# Altium footprint library 6-Connectors-4.PcbLib: 166 footprints (part 1 of 12)
Each footprint in its own frame and in the unit in brackets; x right, y up, seen from the top. Pads: shape width x height; smd on the part's side, far side on the other; paste and mask are expansions set on the pad; w line width, h text height; cw(c..) or ccw(c..) is an arc to the next point about the centre after c.
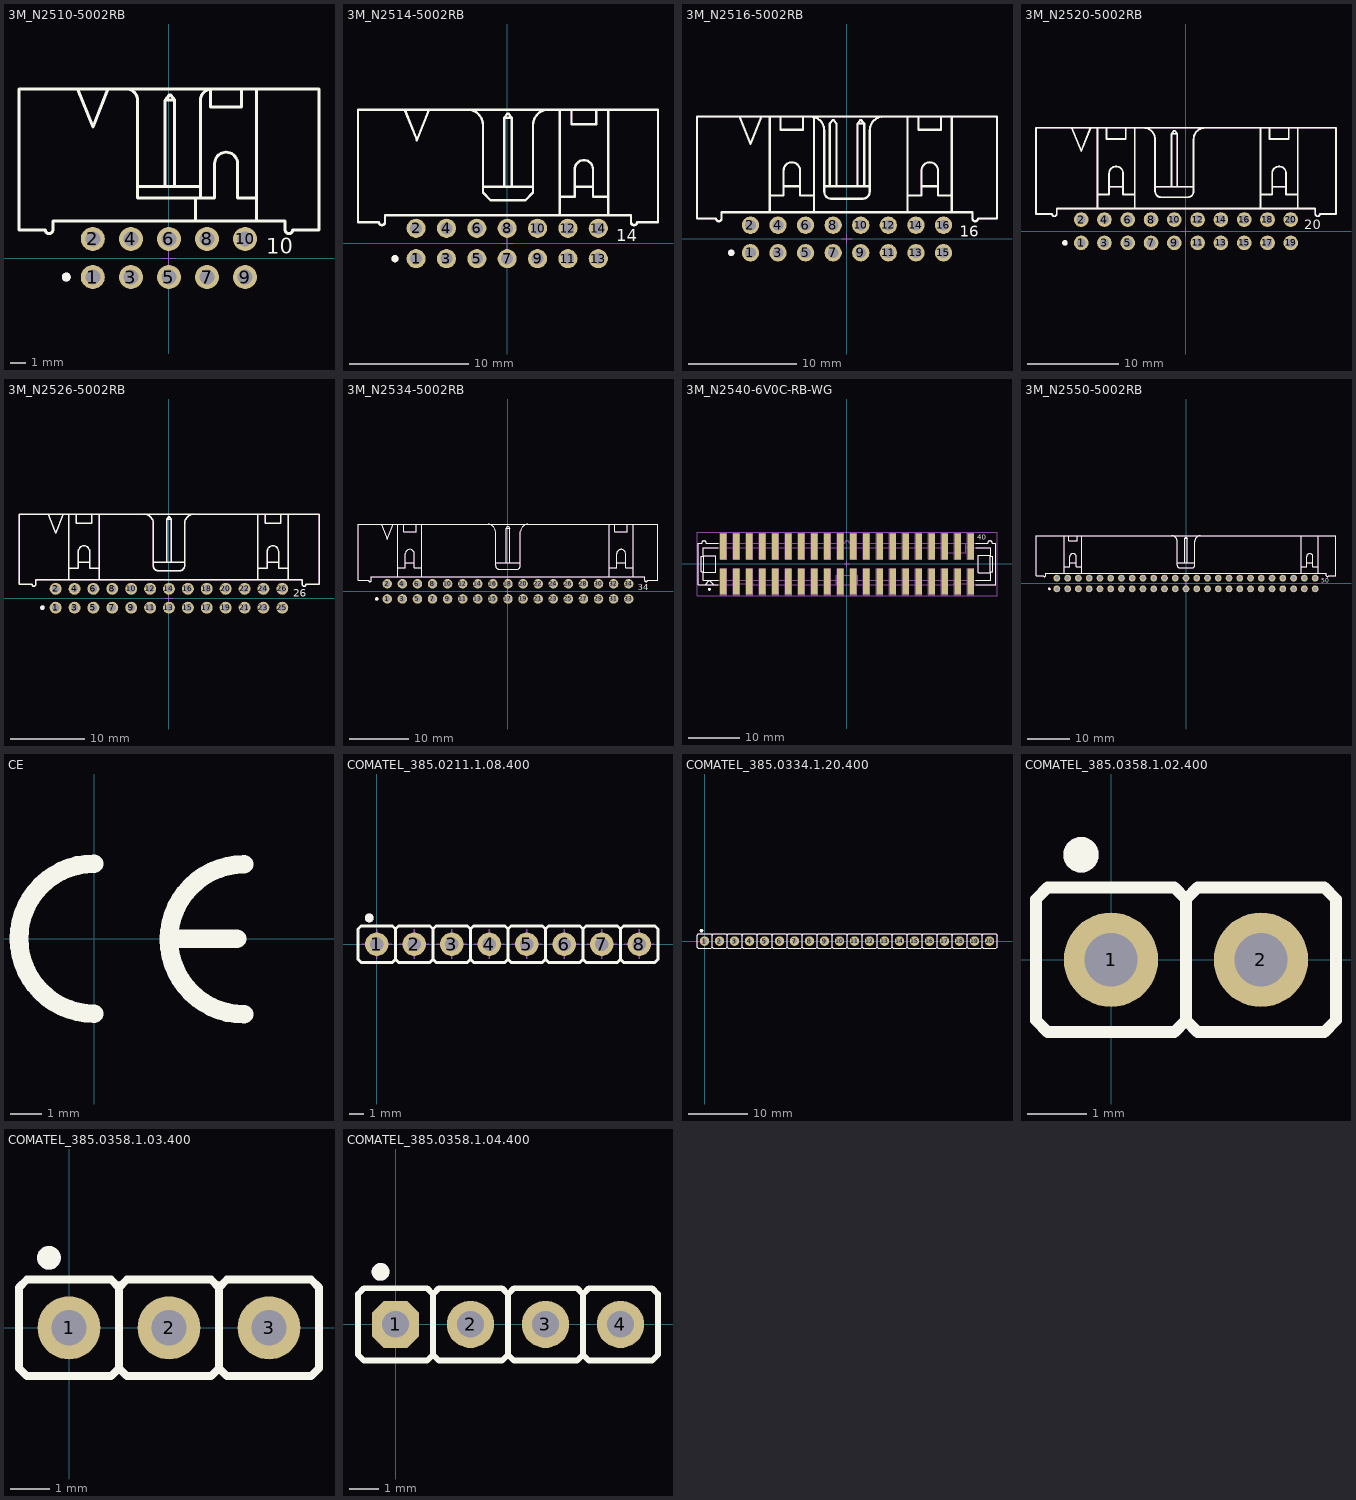
[diagram p0: the footprints below, top view; thin cyan lines are the x and y axes]

## 3M_N2510-5002RB [mm] "10 Contacts - Right Angle .100\" x .100\" Low Profile Four-Wall Header"
height 8.59
pads (10):
  round 1.6 hole 1: 1(-5.08,-1.27) 2(-5.08,1.27) 3(-2.54,-1.27) 4(-2.54,1.27) 5(0,-1.27) 6(0,1.27) 7(2.54,-1.27) 8(2.54,1.27) 9(5.08,-1.27) 10(5.08,1.27)
Top Overlay:
  circle w0.3: c-6.85,-1.27 r0.15
  lines w0.2: -6.093,11.28 -5.077,8.74 -4.061,11.28 ; -2.854,11.28 cw(c-2.854,10.518) -2.092,10.518 -2.092,4.015 2.099,4.015 2.099,10.518 ; -2.092,4.76 2.092,4.76 ; -0.249,4.76 -0.249,10.526 0.012,10.86 0.125,10.86 0.38,10.534 -0.243,10.534 ; 0.38,4.76 0.38,10.526 ; 1.781,2.466 1.781,4.015 3.051,4.015 3.051,6.301 cw(c3.813,6.301) 4.575,6.301 4.575,4.015 5.845,4.015 ; 2.099,10.518 cw(c2.861,10.518) 2.772,11.274 ; 2.772,11.28 2.772,10.06 4.855,10.06 4.855,11.28 ; 5.845,2.466 5.845,11.28 ; -10.004,1.882 -8.252,1.882 ccw(c-7.998,1.882) -7.744,1.882 -7.744,2.466 7.75,2.466 7.75,1.882 ccw(c8.004,1.882) 8.258,1.882 10.011,1.882 10.011,11.28 -10.004,11.28 -10.004,1.882
  text "10" at 6.5,0.3 h1.02
Mechanical 14:
  circle w0.3: c-6.85,-1.27 r0.15
  lines w0.1: -6.093,11.28 -5.077,8.74 -4.061,11.28 ; -2.854,11.28 cw(c-2.854,10.518) -2.092,10.518 -2.092,4.015 2.099,4.015 2.099,10.518 ; -2.092,4.76 2.092,4.76 ; -0.249,4.76 -0.249,10.526 0.012,10.86 0.125,10.86 0.38,10.534 -0.243,10.534 ; 0.38,4.76 0.38,10.526 ; 1.781,2.466 1.781,4.015 3.051,4.015 3.051,6.301 cw(c3.813,6.301) 4.575,6.301 4.575,4.015 5.845,4.015 ; 2.099,10.518 cw(c2.861,10.518) 2.772,11.274 ; 2.772,11.28 2.772,10.06 4.855,10.06 4.855,11.28 ; 5.845,2.466 5.845,11.28 ; -10.004,1.882 -8.252,1.882 ccw(c-7.998,1.882) -7.744,1.882 -7.744,2.466 7.75,2.466 7.75,1.882 ccw(c8.004,1.882) 8.258,1.882 10.011,1.882 10.011,11.28 -10.004,11.28 -10.004,1.882
  text "10" at 6.5,0.3 h1.02
Mechanical 15:
  lines w0.05: -0.5,0 0.5,0 ; 0,-0.5 0,0.5
3D body "3M_N2510-5002RB.stp": height 8.64, standoff -3.98, extent -10.033,-1.778 9.982,11.076
3D body "v160-100.stp": height 0.02, standoff -1.65, extent -5.88,0.47 -4.28,2.07
3D body "v160-100.stp": height 0.02, standoff -1.65, extent -5.88,-2.07 -4.28,-0.47
3D body "v160-100.stp": height 0.02, standoff -1.65, extent -3.34,0.47 -1.74,2.07
3D body "v160-100.stp": height 0.02, standoff -1.65, extent -3.34,-2.07 -1.74,-0.47
3D body "v160-100.stp": height 0.02, standoff -1.65, extent -0.8,-2.07 0.8,-0.47
3D body "v160-100.stp": height 0.02, standoff -1.65, extent -0.8,0.47 0.8,2.07
3D body "v160-100.stp": height 0.02, standoff -1.65, extent 1.74,-2.07 3.34,-0.47
3D body "v160-100.stp": height 0.02, standoff -1.65, extent 1.74,0.47 3.34,2.07
3D body "v160-100.stp": height 0.02, standoff -1.65, extent 4.28,-2.07 5.88,-0.47
3D body "v160-100.stp": height 0.02, standoff -1.65, extent 4.28,0.47 5.88,2.07

## 3M_N2514-5002RB [mm] "14 Contacts - Right Angle .100\" x .100\" Low Profile Four-Wall Header"
height 8.59
pads (14):
  round 1.6 hole 1: 1(-7.62,-1.27) 2(-7.62,1.27) 3(-5.08,-1.27) 4(-5.08,1.27) 5(-2.54,-1.27) 6(-2.54,1.27) 7(0,-1.27) 8(0,1.27) 9(2.54,-1.27) 10(2.54,1.27) 11(5.08,-1.27) 12(5.08,1.27) 13(7.62,-1.27) 14(7.62,1.27)
Top Overlay:
  circle w0.3: c-9.39,-1.27 r0.15
  lines w0.2: -8.568,11.186 -7.552,8.646 -6.536,11.186 ; -3.297,11.186 cw(c-3.297,9.916) -2.027,9.916 -2.027,4.252 -1.392,3.617 1.529,3.617 2.164,4.252 2.164,9.916 cw(c3.434,9.916) 3.434,11.186 ; -2.027,4.76 2.164,4.76 ; -0.249,4.76 -0.249,10.526 0.012,10.86 0.125,10.86 0.38,10.534 -0.243,10.534 ; 0.38,4.76 0.38,10.526 ; 4.399,2.372 4.399,11.186 ; 4.399,3.922 5.656,3.922 5.656,6.208 cw(c6.418,6.208) 7.18,6.208 7.18,3.922 8.45,3.922 ; 5.377,11.186 5.377,9.967 7.46,9.967 7.46,11.186 ; 5.656,4.76 7.18,4.76 ; 8.45,2.372 8.45,11.186 ; -12.479,1.788 -12.479,11.186 12.616,11.186 12.616,1.788 10.863,1.788 cw(c10.609,1.788) 10.355,1.788 10.355,2.372 -10.219,2.372 -10.219,1.788 cw(c-10.473,1.788) -10.727,1.788 -12.479,1.788
  text "14" at 9.105,0.207 h1.02
Mechanical 14:
  circle w0.3: c-9.39,-1.27 r0.15
  lines w0.1: -8.568,11.186 -7.552,8.646 -6.536,11.186 ; -3.297,11.186 cw(c-3.297,9.916) -2.027,9.916 -2.027,4.252 -1.392,3.617 1.529,3.617 2.164,4.252 2.164,9.916 cw(c3.434,9.916) 3.434,11.186 ; -2.027,4.76 2.164,4.76 ; -0.249,4.76 -0.249,10.526 0.012,10.86 0.125,10.86 0.38,10.534 -0.243,10.534 ; 0.38,4.76 0.38,10.526 ; 4.399,2.372 4.399,11.186 ; 4.399,3.922 5.656,3.922 5.656,6.208 cw(c6.418,6.208) 7.18,6.208 7.18,3.922 8.45,3.922 ; 5.377,11.186 5.377,9.967 7.46,9.967 7.46,11.186 ; 5.656,4.76 7.18,4.76 ; 8.45,2.372 8.45,11.186 ; -12.479,1.788 -12.479,11.186 12.616,11.186 12.616,1.788 10.863,1.788 cw(c10.609,1.788) 10.355,1.788 10.355,2.372 -10.219,2.372 -10.219,1.788 cw(c-10.473,1.788) -10.727,1.788 -12.479,1.788
  text "14" at 9.105,0.207 h1.02
Mechanical 15:
  lines w0.05: -0.5,0 0.5,0 ; 0,-0.5 0,0.5
3D body "v160-100.stp": height 0.02, standoff -1.65, extent 6.82,0.47 8.42,2.07
3D body "v160-100.stp": height 0.02, standoff -1.65, extent 6.82,-2.07 8.42,-0.47
3D body "v160-100.stp": height 0.02, standoff -1.65, extent 4.28,0.47 5.88,2.07
3D body "v160-100.stp": height 0.02, standoff -1.65, extent 4.28,-2.07 5.88,-0.47
3D body "v160-100.stp": height 0.02, standoff -1.65, extent 1.74,0.47 3.34,2.07
3D body "v160-100.stp": height 0.02, standoff -1.65, extent 1.74,-2.07 3.34,-0.47
3D body "v160-100.stp": height 0.02, standoff -1.65, extent -0.8,0.47 0.8,2.07
3D body "v160-100.stp": height 0.02, standoff -1.65, extent -0.8,-2.07 0.8,-0.47
3D body "v160-100.stp": height 0.02, standoff -1.65, extent -3.34,0.47 -1.74,2.07
3D body "v160-100.stp": height 0.02, standoff -1.65, extent -3.34,-2.07 -1.74,-0.47
3D body "v160-100.stp": height 0.02, standoff -1.65, extent -5.88,0.47 -4.28,2.07
3D body "v160-100.stp": height 0.02, standoff -1.65, extent -5.88,-2.07 -4.28,-0.47
3D body "v160-100.stp": height 0.02, standoff -1.65, extent -8.42,0.47 -6.82,2.07
3D body "v160-100.stp": height 0.02, standoff -1.65, extent -8.42,-2.07 -6.82,-0.47
3D body "3M_N2514-5002RB.stp": height 8.64, standoff -3.98, extent -12.479,-1.681 12.616,11.174

## 3M_N2516-5002RB [mm] "16 Contacts - Right Angle .100\" x .100\" Low Profile Four-Wall Header"
height 8.59
pads (16):
  round 1.6 hole 1: 1(-8.89,-1.27) 2(-8.89,1.27) 3(-6.35,-1.27) 4(-6.35,1.27) 5(-3.81,-1.27) 6(-3.81,1.27) 7(-1.27,-1.27) 8(-1.27,1.27) 9(1.27,-1.27) 10(1.27,1.27) 11(3.81,-1.27) 12(3.81,1.27) 13(6.35,-1.27) 14(6.35,1.27) 15(8.89,-1.27) 16(8.89,1.27)
Top Overlay:
  circle w0.3: c-10.66,-1.27 r0.15
  lines w0.2: -9.903,11.28 -8.887,8.74 -7.871,11.28 ; -7.109,2.466 -7.109,11.28 ; -7.109,4.015 -5.839,4.015 -5.839,6.301 cw(c-5.077,6.301) -4.315,6.301 -4.315,4.015 -3.045,4.015 ; -6.118,11.28 -6.118,10.06 -4.035,10.06 -4.035,11.28 ; -5.839,4.854 -4.315,4.853 ; -3.362,11.28 cw(c-3.362,10.01) -2.092,10.01 -2.092,4.345 ccw(c-1.457,4.345) -1.457,3.71 ; -3.045,2.466 -3.045,11.239 ; -2.092,4.853 2.099,4.853 ; -1.584,4.853 -1.584,10.619 -1.323,10.954 -1.21,10.954 -0.956,10.628 -0.956,4.853 ; -1.457,3.71 1.464,3.71 ; 0.956,4.853 0.962,10.628 ; 1.464,3.71 ccw(c1.464,4.345) 2.099,4.345 2.099,10.01 ; 1.584,4.853 1.584,10.619 ; 2.099,10.01 cw(c3.369,10.01) 3.369,11.28 ; 5.591,2.466 5.591,11.28 ; 5.591,4.015 6.861,4.015 6.861,6.301 cw(c7.623,6.301) 8.385,6.301 8.385,4.015 9.655,4.015 ; 6.582,11.28 6.582,10.06 8.665,10.06 8.665,11.28 ; 6.861,4.853 8.385,4.853 ; 9.655,2.466 9.655,11.28 ; 0.962,10.628 1.584,10.619 ; 0.962,10.628 1.217,10.954 1.33,10.954 1.584,10.619 ; -13.814,1.882 -12.062,1.882 ccw(c-11.808,1.882) -11.554,1.882 -11.554,2.466 11.56,2.466 11.56,1.882 ccw(c11.814,1.882) 12.068,1.882 13.821,1.882 13.821,11.28 -13.814,11.28 -13.814,1.882
  text "16" at 10.375,0.207 h1.02
Mechanical 14:
  circle w0.3: c-10.66,-1.27 r0.15
  lines w0.1: -9.903,11.28 -8.887,8.74 -7.871,11.28 ; -7.109,2.466 -7.109,11.28 ; -7.109,4.015 -5.839,4.015 -5.839,6.301 cw(c-5.077,6.301) -4.315,6.301 -4.315,4.015 -3.045,4.015 ; -6.118,11.28 -6.118,10.06 -4.035,10.06 -4.035,11.28 ; -5.839,4.854 -4.315,4.853 ; -3.362,11.28 cw(c-3.362,10.01) -2.092,10.01 -2.092,4.345 ccw(c-1.457,4.345) -1.457,3.71 ; -3.045,2.466 -3.045,11.239 ; -2.092,4.853 2.099,4.853 ; -1.584,4.853 -1.584,10.619 -1.323,10.954 -1.21,10.954 -0.956,10.628 -0.956,4.853 ; -1.457,3.71 1.464,3.71 ; 0.956,4.853 0.962,10.628 ; 1.464,3.71 ccw(c1.464,4.345) 2.099,4.345 2.099,10.01 ; 1.584,4.853 1.584,10.619 ; 2.099,10.01 cw(c3.369,10.01) 3.369,11.28 ; 5.591,2.466 5.591,11.28 ; 5.591,4.015 6.861,4.015 6.861,6.301 cw(c7.623,6.301) 8.385,6.301 8.385,4.015 9.655,4.015 ; 6.582,11.28 6.582,10.06 8.665,10.06 8.665,11.28 ; 6.861,4.853 8.385,4.853 ; 9.655,2.466 9.655,11.28 ; 0.962,10.628 1.584,10.619 ; 0.962,10.628 1.217,10.954 1.33,10.954 1.584,10.619 ; -13.814,1.882 -12.062,1.882 ccw(c-11.808,1.882) -11.554,1.882 -11.554,2.466 11.56,2.466 11.56,1.882 ccw(c11.814,1.882) 12.068,1.882 13.821,1.882 13.821,11.28 -13.814,11.28 -13.814,1.882
  text "16" at 10.375,0.207 h1.02
Mechanical 15:
  lines w0.05: -0.5,0 0.5,0 ; 0,-0.5 0,0.5
3D body "v160-080.stp": height 0.02, standoff -1.65, extent 8.09,-2.07 9.69,-0.47
3D body "v160-080.stp": height 0.02, standoff -1.65, extent 8.09,0.47 9.69,2.07
3D body "v160-080.stp": height 0.02, standoff -1.65, extent 5.55,0.47 7.15,2.07
3D body "v160-080.stp": height 0.02, standoff -1.65, extent 5.55,-2.07 7.15,-0.47
3D body "v160-080.stp": height 0.02, standoff -1.65, extent 3.01,-2.07 4.61,-0.47
3D body "v160-080.stp": height 0.02, standoff -1.65, extent 3.01,0.47 4.61,2.07
3D body "v160-080.stp": height 0.02, standoff -1.65, extent 0.47,0.47 2.07,2.07
3D body "v160-080.stp": height 0.02, standoff -1.65, extent 0.47,-2.07 2.07,-0.47
3D body "v160-080.stp": height 0.02, standoff -1.65, extent -2.07,-2.07 -0.47,-0.47
3D body "v160-080.stp": height 0.02, standoff -1.65, extent -2.07,0.47 -0.47,2.07
3D body "v160-080.stp": height 0.02, standoff -1.65, extent -4.61,0.47 -3.01,2.07
3D body "v160-080.stp": height 0.02, standoff -1.65, extent -4.61,-2.07 -3.01,-0.47
3D body "v160-080.stp": height 0.02, standoff -1.65, extent -7.15,-2.07 -5.55,-0.47
3D body "v160-080.stp": height 0.02, standoff -1.65, extent -7.15,0.47 -5.55,2.07
3D body "v160-080.stp": height 0.02, standoff -1.65, extent -9.69,0.47 -8.09,2.07
3D body "v160-080.stp": height 0.02, standoff -1.65, extent -9.69,-2.07 -8.09,-0.47
3D body "3M_N2516-5002RB.stp": height 8.64, standoff -3.98, extent -13.814,-1.587 13.821,11.267

## 3M_N2520-5002RB [mm] "20 Contacts - Right Angle .100\" x .100\" Low Profile Four-Wall Header"
height 8.59
pads (20):
  round 1.6 hole 1: 1(-11.43,-1.27) 2(-11.43,1.27) 3(-8.89,-1.27) 4(-8.89,1.27) 5(-6.35,-1.27) 6(-6.35,1.27) 7(-3.81,-1.27) 8(-3.81,1.27) 9(-1.27,-1.27) 10(-1.27,1.27) 11(1.27,-1.27) 12(1.27,1.27) 13(3.81,-1.27) 14(3.81,1.27) 15(6.35,-1.27) 16(6.35,1.27) 17(8.89,-1.27) 18(8.89,1.27) 19(11.43,-1.27) 20(11.43,1.27)
Top Overlay:
  circle w0.3: c-13.2,-1.27 r0.15
  lines w0.2: -12.443,11.28 -11.427,8.74 -10.411,11.28 ; -9.649,2.466 -9.649,11.28 ; -9.649,4.015 -8.379,4.015 -8.379,6.301 cw(c-7.617,6.301) -6.855,6.301 -6.855,4.015 -5.585,4.015 ; -8.658,11.28 -8.658,10.06 -6.575,10.06 -6.575,11.28 ; -8.379,4.854 -6.855,4.853 ; -5.585,2.466 -5.585,11.239 ; -4.632,11.28 cw(c-4.632,10.01) -3.362,10.01 -3.362,4.345 ccw(c-2.727,4.345) -2.727,3.71 0.194,3.71 ; -3.362,4.853 0.829,4.853 ; -1.581,4.853 -0.953,4.853 -0.953,10.619 ; -1.575,4.853 -1.575,10.628 ; 0.194,3.71 ccw(c0.194,4.345) 0.829,4.345 0.829,10.01 cw(c2.099,10.01) 2.099,11.28 ; 8.131,2.466 8.131,11.28 ; 8.131,4.015 9.401,4.015 9.401,6.301 cw(c10.163,6.301) 10.925,6.301 10.925,4.015 12.195,4.015 ; 9.122,11.28 9.122,10.06 11.205,10.06 11.205,11.28 ; 9.401,4.853 10.925,4.853 ; 12.195,2.466 12.195,11.28 ; -1.575,10.628 -1.32,10.954 -1.207,10.954 -0.953,10.619 ; -1.575,10.628 -0.953,10.619 ; -16.354,1.882 -16.354,11.28 16.361,11.28 16.361,1.882 14.608,1.882 cw(c14.354,1.882) 14.1,1.882 14.1,2.466 -14.094,2.466 -14.094,1.882 cw(c-14.348,1.882) -14.602,1.882 -16.354,1.882
  text "20" at 12.915,0.207 h1.02
Mechanical 14:
  circle w0.3: c-13.2,-1.27 r0.15
  lines w0.1: -12.443,11.28 -11.427,8.74 -10.411,11.28 ; -9.649,2.466 -9.649,11.28 ; -9.649,4.015 -8.379,4.015 -8.379,6.301 cw(c-7.617,6.301) -6.855,6.301 -6.855,4.015 -5.585,4.015 ; -8.658,11.28 -8.658,10.06 -6.575,10.06 -6.575,11.28 ; -8.379,4.854 -6.855,4.853 ; -5.585,2.466 -5.585,11.239 ; -4.632,11.28 cw(c-4.632,10.01) -3.362,10.01 -3.362,4.345 ccw(c-2.727,4.345) -2.727,3.71 0.194,3.71 ; -3.362,4.853 0.829,4.853 ; -1.581,4.853 -0.953,4.853 -0.953,10.619 ; -1.575,4.853 -1.575,10.628 ; 0.194,3.71 ccw(c0.194,4.345) 0.829,4.345 0.829,10.01 cw(c2.099,10.01) 2.099,11.28 ; 8.131,2.466 8.131,11.28 ; 8.131,4.015 9.401,4.015 9.401,6.301 cw(c10.163,6.301) 10.925,6.301 10.925,4.015 12.195,4.015 ; 9.122,11.28 9.122,10.06 11.205,10.06 11.205,11.28 ; 9.401,4.853 10.925,4.853 ; 12.195,2.466 12.195,11.28 ; -1.575,10.628 -1.32,10.954 -1.207,10.954 -0.953,10.619 ; -1.575,10.628 -0.953,10.619 ; -16.354,1.882 -16.354,11.28 16.361,11.28 16.361,1.882 14.608,1.882 cw(c14.354,1.882) 14.1,1.882 14.1,2.466 -14.094,2.466 -14.094,1.882 cw(c-14.348,1.882) -14.602,1.882 -16.354,1.882
  text "20" at 12.915,0.207 h1.02
Mechanical 15:
  lines w0.05: -0.5,0 0.5,0 ; 0,-0.5 0,0.5
3D body "v160-080.stp": height 0.02, standoff -1.65, extent 10.63,0.47 12.23,2.07
3D body "v160-080.stp": height 0.02, standoff -1.65, extent 10.63,-2.07 12.23,-0.47
3D body "v160-080.stp": height 0.02, standoff -1.65, extent 8.09,-2.07 9.69,-0.47
3D body "v160-080.stp": height 0.02, standoff -1.65, extent 8.09,0.47 9.69,2.07
3D body "v160-080.stp": height 0.02, standoff -1.65, extent 5.55,0.47 7.15,2.07
3D body "v160-080.stp": height 0.02, standoff -1.65, extent 5.55,-2.07 7.15,-0.47
3D body "v160-080.stp": height 0.02, standoff -1.65, extent 3.01,-2.07 4.61,-0.47
3D body "v160-080.stp": height 0.02, standoff -1.65, extent 3.01,0.47 4.61,2.07
3D body "v160-080.stp": height 0.02, standoff -1.65, extent 0.47,-2.07 2.07,-0.47
3D body "v160-080.stp": height 0.02, standoff -1.65, extent 0.47,0.47 2.07,2.07
3D body "v160-080.stp": height 0.02, standoff -1.65, extent -2.07,0.47 -0.47,2.07
3D body "v160-080.stp": height 0.02, standoff -1.65, extent -2.07,-2.07 -0.47,-0.47
3D body "v160-080.stp": height 0.02, standoff -1.65, extent -4.61,-2.07 -3.01,-0.47
3D body "v160-080.stp": height 0.02, standoff -1.65, extent -4.61,0.47 -3.01,2.07
3D body "v160-080.stp": height 0.02, standoff -1.65, extent -7.15,0.47 -5.55,2.07
3D body "v160-080.stp": height 0.02, standoff -1.65, extent -7.15,-2.07 -5.55,-0.47
3D body "v160-080.stp": height 0.02, standoff -1.65, extent -9.69,-2.07 -8.09,-0.47
3D body "v160-080.stp": height 0.02, standoff -1.65, extent -12.23,-2.07 -10.63,-0.47
3D body "v160-080.stp": height 0.02, standoff -1.65, extent -9.69,0.47 -8.09,2.07
3D body "v160-080.stp": height 0.02, standoff -1.65, extent -12.23,0.47 -10.63,2.07
3D body "3M_N2520-5002RB.stp": height 8.64, standoff -3.98, extent -16.354,-1.587 16.361,11.267

## 3M_N2526-5002RB [mm] "26 Contacts - Right Angle .100\" x .100\" Low Profile Four-Wall Header"
height 8.59
pads (26):
  round 1.6 hole 1: 1(-15.24,-1.27) 2(-15.24,1.27) 3(-12.7,-1.27) 4(-12.7,1.27) 5(-10.16,-1.27) 6(-10.16,1.27) 7(-7.62,-1.27) 8(-7.62,1.27) 9(-5.08,-1.27) 10(-5.08,1.27) 11(-2.54,-1.27) 12(-2.54,1.27) 13(0,-1.27) 14(0,1.27) 15(2.54,-1.27) 16(2.54,1.27) 17(5.08,-1.27) 18(5.08,1.27) 19(7.62,-1.27) 20(7.62,1.27) 21(10.16,-1.27) 22(10.16,1.27) 23(12.7,-1.27) 24(12.7,1.27) 25(15.24,-1.27) 26(15.24,1.27)
Top Overlay:
  circle w0.3: c-17.01,-1.27 r0.15
  lines w0.2: -16.253,11.28 -15.237,8.74 -14.221,11.28 ; -13.459,2.466 -13.459,11.28 ; -13.459,4.015 -12.189,4.015 -12.189,6.301 cw(c-11.427,6.301) -10.665,6.301 -10.665,4.015 -9.395,4.015 ; -12.468,11.28 -12.468,10.06 -10.385,10.06 -10.385,11.28 ; -12.189,4.853 -10.665,4.853 ; -9.395,2.466 -9.395,11.28 ; -3.362,11.28 cw(c-3.362,10.01) -2.092,10.01 -2.092,4.345 ccw(c-1.457,4.345) -1.457,3.71 ; -2.092,4.853 2.099,4.853 ; -1.457,3.71 1.464,3.71 ; -0.311,4.853 0.318,4.853 0.318,10.619 ; -0.305,4.853 -0.305,10.628 ; 1.464,3.71 ccw(c1.464,4.345) 2.099,4.345 2.099,10.01 ; 2.099,10.01 cw(c3.369,10.01) 3.369,11.28 ; 11.941,2.466 11.941,11.28 ; 11.941,4.015 13.211,4.015 13.211,6.301 cw(c13.973,6.301) 14.735,6.301 14.735,4.015 16.005,4.015 ; 12.932,11.28 12.932,10.06 15.015,10.06 15.015,11.28 ; 13.211,4.853 14.735,4.853 ; 16.005,2.466 16.005,11.28 ; -0.305,10.628 -0.05,10.954 0.063,10.954 0.318,10.619 ; -0.305,10.628 0.318,10.619 ; -20.164,1.882 -20.164,11.28 20.171,11.28 20.171,1.882 18.418,1.882 cw(c18.164,1.882) 17.91,1.882 17.91,2.466 -17.904,2.466 -17.904,1.882 cw(c-18.158,1.882) -18.412,1.882 -20.164,1.882
  text "26" at 16.725,0.206 h1.02
Mechanical 14:
  circle w0.3: c-17.01,-1.27 r0.15
  lines w0.1: -16.253,11.28 -15.237,8.74 -14.221,11.28 ; -13.459,2.466 -13.459,11.28 ; -13.459,4.015 -12.189,4.015 -12.189,6.301 cw(c-11.427,6.301) -10.665,6.301 -10.665,4.015 -9.395,4.015 ; -12.468,11.28 -12.468,10.06 -10.385,10.06 -10.385,11.28 ; -12.189,4.853 -10.665,4.853 ; -9.395,2.466 -9.395,11.28 ; -3.362,11.28 cw(c-3.362,10.01) -2.092,10.01 -2.092,4.345 ccw(c-1.457,4.345) -1.457,3.71 ; -2.092,4.853 2.099,4.853 ; -1.457,3.71 1.464,3.71 ; -0.311,4.853 0.318,4.853 0.318,10.619 ; -0.305,4.853 -0.305,10.628 ; 1.464,3.71 ccw(c1.464,4.345) 2.099,4.345 2.099,10.01 ; 2.099,10.01 cw(c3.369,10.01) 3.369,11.28 ; 11.941,2.466 11.941,11.28 ; 11.941,4.015 13.211,4.015 13.211,6.301 cw(c13.973,6.301) 14.735,6.301 14.735,4.015 16.005,4.015 ; 12.932,11.28 12.932,10.06 15.015,10.06 15.015,11.28 ; 13.211,4.853 14.735,4.853 ; 16.005,2.466 16.005,11.28 ; -0.305,10.628 -0.05,10.954 0.063,10.954 0.318,10.619 ; -0.305,10.628 0.318,10.619 ; -20.164,1.882 -20.164,11.28 20.171,11.28 20.171,1.882 18.418,1.882 cw(c18.164,1.882) 17.91,1.882 17.91,2.466 -17.904,2.466 -17.904,1.882 cw(c-18.158,1.882) -18.412,1.882 -20.164,1.882
  text "26" at 16.725,0.206 h1.02
Mechanical 15:
  lines w0.05: -0.5,0 0.5,0 ; 0,-0.5 0,0.5
3D body "v160-080.stp": height 0.02, standoff -1.65, extent 14.44,0.47 16.04,2.07
3D body "v160-080.stp": height 0.02, standoff -1.65, extent 14.44,-2.07 16.04,-0.47
3D body "v160-080.stp": height 0.02, standoff -1.65, extent 11.9,0.47 13.5,2.07
3D body "v160-080.stp": height 0.02, standoff -1.65, extent 11.9,-2.07 13.5,-0.47
3D body "v160-080.stp": height 0.02, standoff -1.65, extent 9.36,0.47 10.96,2.07
3D body "v160-080.stp": height 0.02, standoff -1.65, extent 9.36,-2.07 10.96,-0.47
3D body "v160-080.stp": height 0.02, standoff -1.65, extent 6.82,0.47 8.42,2.07
3D body "v160-080.stp": height 0.02, standoff -1.65, extent 6.82,-2.07 8.42,-0.47
3D body "v160-080.stp": height 0.02, standoff -1.65, extent 4.28,0.47 5.88,2.07
3D body "v160-080.stp": height 0.02, standoff -1.65, extent 4.28,-2.07 5.88,-0.47
3D body "v160-080.stp": height 0.02, standoff -1.65, extent 1.74,0.47 3.34,2.07
3D body "v160-080.stp": height 0.02, standoff -1.65, extent 1.74,-2.07 3.34,-0.47
3D body "v160-080.stp": height 0.02, standoff -1.65, extent -0.8,0.47 0.8,2.07
3D body "v160-080.stp": height 0.02, standoff -1.65, extent -0.8,-2.07 0.8,-0.47
3D body "v160-080.stp": height 0.02, standoff -1.65, extent -3.34,0.47 -1.74,2.07
3D body "v160-080.stp": height 0.02, standoff -1.65, extent -3.34,-2.07 -1.74,-0.47
3D body "v160-080.stp": height 0.02, standoff -1.65, extent -5.88,0.47 -4.28,2.07
3D body "v160-080.stp": height 0.02, standoff -1.65, extent -5.88,-2.07 -4.28,-0.47
3D body "v160-080.stp": height 0.02, standoff -1.65, extent -8.42,0.47 -6.82,2.07
3D body "v160-080.stp": height 0.02, standoff -1.65, extent -8.42,-2.07 -6.82,-0.47
3D body "v160-080.stp": height 0.02, standoff -1.65, extent -10.96,-2.07 -9.36,-0.47
3D body "v160-080.stp": height 0.02, standoff -1.65, extent -10.96,0.47 -9.36,2.07
3D body "v160-080.stp": height 0.02, standoff -1.65, extent -13.5,-2.07 -11.9,-0.47
3D body "v160-080.stp": height 0.02, standoff -1.65, extent -13.5,0.47 -11.9,2.07
3D body "v160-080.stp": height 0.02, standoff -1.65, extent -16.04,0.47 -14.44,2.07
3D body "v160-080.stp": height 0.02, standoff -1.65, extent -16.04,-2.07 -14.44,-0.47
3D body "3M_N2526-5002RB.stp": height 8.64, standoff -3.98, extent -20.164,-1.587 20.171,11.267
